# Altium footprint library Custom_Library.PcbLib: 221 footprints (part 10 of 14)
Each footprint in its own frame and in the unit in brackets; x right, y up, seen from the top. Pads: shape width x height; smd on the part's side, far side on the other; paste and mask are expansions set on the pad; w line width, h text height; cw(c..) or ccw(c..) is an arc to the next point about the centre after c.
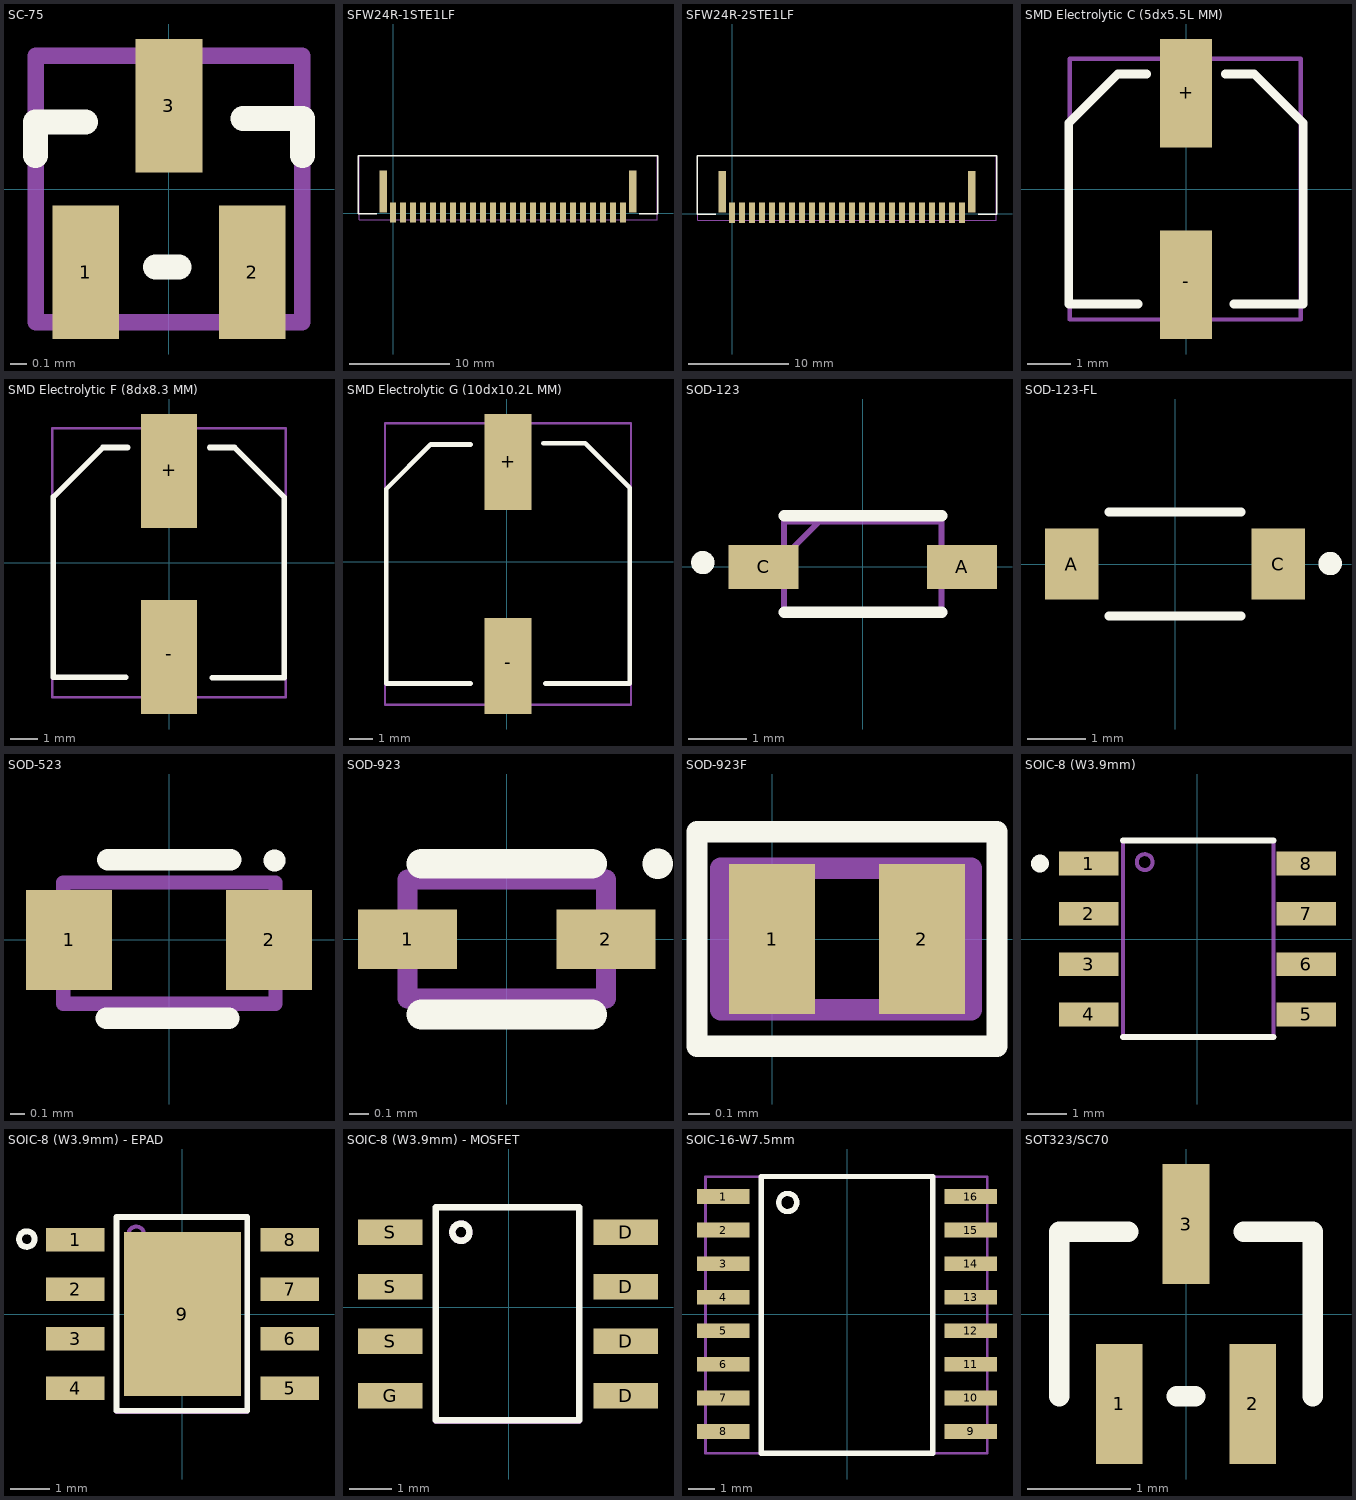
[diagram p9: the footprints below, top view; thin cyan lines are the x and y axes]

## SC-75 [mm]
pads (3):
  rect 0.4x0.8 smd: 1(-0.5,-0.5) 2(0.5,-0.5) 3(0,0.5)
Top Overlay:
  lines w0.15: -0.8,0.2 -0.8,0.403 -0.5,0.403 ; -0.08,-0.468 0.061,-0.468 ; 0.443,0.423 0.8,0.423 0.8,0.2
Top Assembly:
  lines w0.1: -0.8,-0.8 0,-0.8 0.8,-0.8 0.8,0.3 0.8,0.8 -0.7,0.8 -0.8,0.8 -0.8,0.4 -0.8,-0.8
  text "'.Designator'" at -2.79,-1.86 h1.27
3D body "User Library-SC-75A.STEP": height 0.68, standoff -0.03, extent -0.8,-0.79 0.8,0.81

## SFW24R-1STE1LF [mil]
pads (26):
  rect 24x79 smd: 1(905.26,3.61) 2(865.89,3.61) 3(826.52,3.61) 4(787.15,3.61) 5(747.78,3.61) 6(708.41,3.61) 7(669.04,3.61) 8(629.67,3.61) 9(590.3,3.61) 10(550.93,3.61) 11(511.56,3.61) 12(472.19,3.61) 13(432.81,3.61) 14(393.44,3.61) 15(354.07,3.61) 16(314.7,3.61) 17(275.33,3.61) 18(235.96,3.61) 19(196.59,3.61) 20(157.22,3.61) 21(117.85,3.61) 22(78.48,3.61) 23(39.11,3.61) 24(-0.26,3.61)
  rect 28x165 smd: G1(-39.37,86.61) G2(944.37,86.61)
Top Overlay:
  lines w5.91: -65.26,-1.39 -138.87,-1.39 -138.87,228.35 1043.87,228.35 1043.87,-1.39 970.26,-1.39
Top Assembly:
  lines w3.94: -134.28,-25 1039.97,-25 1039.97,228.74 -134.28,228.74 -134.28,-25
  text "'.Designator'" at 245,100 h78.74
3D body "SFW24R-1STE1LF.STEP": height 106.3, standoff 0, extent -133.86,-27.95 1039.37,227.95

## SFW24R-2STE1LF [mil]
pads (26):
  rect 24x79 smd: 1(905.26,3.61) 2(865.89,3.61) 3(826.52,3.61) 4(787.15,3.61) 5(747.78,3.61) 6(708.41,3.61) 7(669.04,3.61) 8(629.67,3.61) 9(590.3,3.61) 10(550.93,3.61) 11(511.56,3.61) 12(472.19,3.61) 13(432.81,3.61) 14(393.44,3.61) 15(354.07,3.61) 16(314.7,3.61) 17(275.33,3.61) 18(235.96,3.61) 19(196.59,3.61) 20(157.22,3.61) 21(117.85,3.61) 22(78.48,3.61) 23(39.11,3.61) 24(-0.26,3.61)
  rect 28x165 smd: G1(-39.37,86.61) G2(944.37,86.61)
Top Overlay:
  lines w5.91: -65.26,-1.39 -138.87,-1.39 -138.87,228.35 1043.87,228.35 1043.87,-1.39 970.26,-1.39
Top Assembly:
  lines w3.94: -136.51,-25.83 -18.97,-25.83 923.42,-25.83 1041.61,-25.83 1041.61,230.35 -134.06,230.35 -136.51,230.35 -136.51,-25.83
  text "'.Designator'" at 210,95 h78.74
3D body "SFW24R-2STE2 LF.STEP": height 106.3, standoff -0.02, extent -134.25,-27.95 1038.98,227.95

## SMD Electrolytic C (5dx5.5L MM) [mm]
pads (2):
  rect 1.2x2.5 smd: +(0,2.2) -(0,-2.2)
Top Overlay:
  lines w0.2: -1.1,-2.647 -2.7,-2.647 -2.7,1.518 -1.571,2.646 -0.9,2.646 ; 0.9,2.646 1.571,2.646 2.7,1.518 2.7,-2.647 1.1,-2.647
Top Assembly:
  lines w0.1: -2.674,-3 -2.674,2.996 -2.669,2.996 2.64,2.996 2.64,-3 -2.674,-3
  text "'.Designator'" at -3.2,-4.5 h1.27
3D body "aaa.STEP": height 5.8, standoff 0, extent -2.65,-3 2.65,3

## SMD Electrolytic F (8dx8.3 MM) [mm]
pads (2):
  rect 2x4.1 smd: +(0,3.3) -(0,-3.4)
Top Overlay:
  lines w0.2: -1.55,-4.131 -4.159,-4.131 -4.159,1.559 -4.159,2.364 -2.38,4.143 -1.493,4.143 ; 1.47,4.143 2.357,4.143 4.145,2.356 4.145,-4.139 1.555,-4.139
Top Assembly:
  lines w0.1: -4.2,-4.851 4.2,-4.851 4.2,4.836 -4.036,4.836 -4.2,4.836 -4.2,-4.851
  text "'.Designator'" at -3.3,-0.5 h1.27
3D body "asd.STEP": height 10.2, standoff 0, extent -4.15,-4.85 4.15,4.85

## SMD Electrolytic G (10dx10.2L MM) [mm]
pads (2):
  rect 2x4.1 smd: +(0.05,4.25) -(0.05,-4.45)
Top Overlay:
  lines w0.2: -1.55,-5.2 -5.15,-5.2 -5.15,2.55 -5.15,3.1 -3.25,5 -1.55,5 ; 1.55,5.05 3.35,5.05 5.25,3.15 5.25,-5.2 1.65,-5.2
Top Assembly:
  lines w0.1: -5.2,-6.1 5.3,-6.1 5.3,5.9 -2.8,5.9 -5.2,5.9 -5.2,-6.1
  text "'.Designator'" at -3.339,-0.598 h1.27
3D body "CAPAE-D10.0x10.2.stp": height 10.5, standoff 0, extent -5.2,-6.1 5.3,5.9

## SOD-123 [mm]
pads (2):
  rect 1.2x0.75 smd: A(1.7,0) C(-1.7,0)
Top Overlay:
  circle w0.2: c-2.743,0.075 r0.1
  lines w0.2: -1.35,-0.775 1.35,-0.775 ; -1.35,0.876 1.35,0.876
Mechanical 15:
  lines w0.1: -1.35,0.175 -0.75,0.775 ; -1.35,-0.775 1.35,-0.775 1.35,0.775 -1.35,0.775 -1.35,-0.775
3D body "MMSZ5240B-7-F.stp": height 1.45, standoff 0, extent -1.85,-0.775 1.85,0.775

## SOD-123-FL [mil]
pads (2):
  rect 36x48 smd paste+0: A(-69.5,0) C(69.5,0)
Top Overlay:
  circle w7.87: c104.29,0.31 r3.94
  lines w6: -44.39,-35 44.39,-35 ; -44.39,35 44.39,35
3D body "DIODE_SMD16PL-TP_MCC.step": height 44.25, standoff 0, extent -75.98,-30 75.98,30

## SOD-523 [mm]
pads (2):
  rect 0.6x0.7 smd: 1(-0.7,0) 2(0.7,0)
Top Overlay:
  circle w0.152: c0.739,0.557 r0.001
  lines w0.15: -0.44,-0.548 0.42,-0.548 ; -0.428,0.561 0.432,0.561
Top Assembly:
  lines w0.1: -0.741,-0.447 0.746,-0.447 0.746,0.402 -0.741,0.402 -0.741,-0.447
  text "'.Designator'" at -2.866,-1.791 h1.27
3D body: height 0.6, standoff 0, extent -0.7,-0.423 0.7,0.402

## SOD-923 [mm]
pads (2):
  rect 0.5x0.3 smd: 1(-0.5,0) 2(0.5,0)
Top Overlay:
  circle w0.152: c0.762,0.38 r0.001
  lines w0.15: -0.43,-0.38 0.43,-0.38 ; -0.43,0.38 0.43,0.38
Top Assembly:
  lines w0.1: -0.5,-0.3 -0.5,0.3 0.5,0.3 0.5,-0.3 -0.5,-0.3
  text "'.Designator'" at -2.547,-1.591 h1.27
3D body "ESD9B5.0ST5G--3DModel-STEP-56544.STEP": height 0.4, standoff 0, extent -0.5,-0.3 0.5,0.3

## SOD-923F [mm]
pads (2):
  rect 0.4x0.7 smd mask+0.05: 1(0,0) 2(0.7,0)
Top Overlay:
  lines w0.1: -0.35,-0.5 1.05,-0.5 1.05,0.5 -0.35,0.5 -0.35,-0.5
Top Assembly:
  lines w0.1: -0.24,-0.33 0.93,-0.33 0.93,0.13 0.93,0.33 -0.24,0.33 -0.24,0.12 -0.24,-0.33
  text "'.Designator'" at -0.108,2.596 h1.27
3D body "ESD9B5.0ST5G--3DModel-STEP-56544.STEP": height 0.4, standoff 0, extent -0.164,-0.3 0.836,0.3

## SOIC-8 (W3.9mm) [mm]
pads (8):
  rect 1.5x0.6 smd: 1(-2.75,1.905) 2(-2.75,0.635) 3(-2.75,-0.635) 4(-2.75,-1.905) 5(2.75,-1.905) 6(2.75,-0.635) 7(2.75,0.635) 8(2.75,1.905)
Top Overlay:
  circle w0.25: c-3.981,1.906 r0.1
  lines w0.15: -1.883,-2.481 -1.629,-2.481 1.917,-2.481 ; -1.883,2.489 -1.589,2.489 1.917,2.489
Top Assembly:
  circle w0.1: c-1.333,1.943 r0.2
  lines w0.1: -1.883,-2.481 -1.883,2.489 1.917,2.489 1.917,-2.481 -1.883,-2.481
  text "'.Designator'" at -4.679,-4.141 h2
3D body "SOIC08 NXP.STEP": height 2, standoff 0, extent -3.119,-2.506 3.044,2.494

## SOIC-8 (W3.9mm) - EPAD [mm]
pads (9):
  rect 1.5x0.6 smd: 1(-2.75,1.905) 2(-2.75,0.635) 3(-2.75,-0.635) 4(-2.75,-1.905) 5(2.75,-1.905) 6(2.75,-0.635) 7(2.75,0.635) 8(2.75,1.905)
  rect 3x4.2 smd: 9(0,0)
Top Overlay:
  circle w0.15: c-3.991,1.921 r0.2
  lines w0.15: 1.621,-2.481 -1.629,-2.481 -1.689,-2.481 -1.689,2.489 -1.589,2.489 1.661,2.489 1.661,-2.481
Top Assembly:
  circle w0.1: c-1.185,2.042 r0.2
  lines w0.1: -1.689,-2.518 1.661,-2.518 1.661,2.5 -1.689,2.5 -1.689,-2.518
  text "'.Designator'" at -5,-4.1 h2
3D body "User Library-SOIC-8-1.STEP": height 1.75, standoff 0, extent -3.026,-2.462 2.974,2.438

## SOIC-8 (W3.9mm) - MOSFET [mm]
pads (8):
  rect 1.5x0.6 smd: D(2.729,-2.064) D(2.729,0.476) D(2.729,-0.794) D(2.729,1.746) G(-2.771,-2.064) S(-2.771,-0.794) S(-2.771,0.476) S(-2.771,1.746)
Top Overlay:
  circle w0.15: c-1.12,1.75 r0.2
  lines w0.15: 1.6,-2.64 -1.65,-2.64 -1.71,-2.64 -1.71,2.33 -1.61,2.33 1.64,2.33 1.64,-2.64
Top Assembly:
  circle w0.15: c-1.12,1.75 r0.2
  lines w0.1: -1.71,-2.677 -1.71,2.341 1.64,2.341 1.64,-2.677 -1.71,-2.677
  text "'.Designator'" at -4.7,-4.3 h2
3D body "User Library-SOIC-8-1.STEP": height 1.75, standoff 0, extent -3.047,-2.621 2.953,2.279

## SOIC-16-W7.5mm [mil]
pads (16):
  rect 78x22 smd: 1(-184.5,175) 2(-184.5,125) 3(-184.5,75) 4(-184.5,25) 5(-184.5,-25) 6(-184.5,-75) 7(-184.5,-125) 8(-184.5,-175) 9(184.5,-175) 10(184.5,-125) 11(184.5,-75) 12(184.5,-25) 13(184.5,25) 14(184.5,75) 15(184.5,125) 16(184.5,175)
Top Overlay:
  circle w7.87: c-88.31,166.11 r13.45
  lines w7.87: -127.95,-207.5 127.95,-207.5 127.95,204.72 -102.36,204.72 -127.95,204.72 -127.95,-207.5
Top Assembly:
  lines w3.94: -210.77,-207.5 209.24,-207.5 209.24,102.36 209.24,204.72 -102.36,204.72 -210.77,204.72 -210.77,-207.5
  text "'.Designator'" at -122.05,-269.69 h50
3D body: height 10, standoff 0, extent 0,0 10,10
3D body "RW_16_ADI.step": height 104.09, standoff 0, extent -209.49,-206.5 209.49,206.5

## SOT323/SC70 [mil]
pads (3):
  rect 18x46 smd: 1(-25.59,-34.5) 2(25.59,-34.5) 3(0,34.5)
Top Overlay:
  lines w7.87: -48.5,-31.5 -48.5,31.5 -22.1,31.5 ; -3.49,-31.5 3.49,-31.5 ; 22.1,31.5 48.5,31.5 48.5,-31.5
3D body: height 10, standoff 0, extent 0,0 10,10